# Altium footprint library AMLB_v1.PcbLib: 167 footprints (part 11 of 11)
Each footprint in its own frame and in the unit in brackets; x right, y up, seen from the top. Pads: shape width x height; smd on the part's side, far side on the other; paste and mask are expansions set on the pad; w line width, h text height; cw(c..) or ccw(c..) is an arc to the next point about the centre after c.
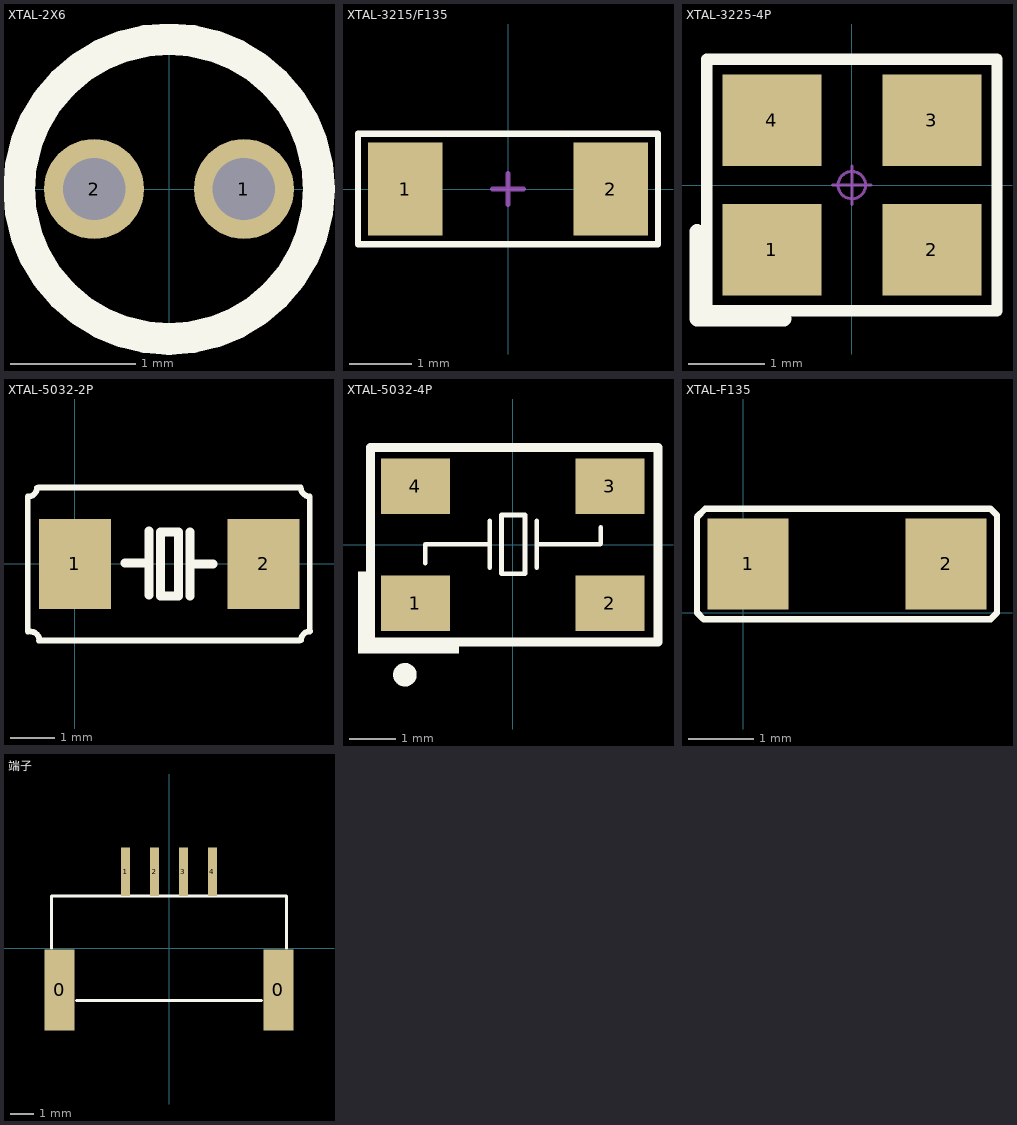
[diagram p10: the footprints below, top view; thin cyan lines are the x and y axes]

## XTAL-2X6 [mm]
pads (2):
  round 0.8 hole 0.5: 1(0.6,0) 2(-0.6,0)
Top Overlay:
  circle w0.254: c0,0 r1.2
3D body "2x6.STEP": height 6.4, standoff -4.9, extent -1.05,-1.05 1.05,1.05

## XTAL-3215/F135 [mm]
pads (2):
  rect 1.2x1.5 smd: 1(-1.65,0) 2(1.65,0)
Top Overlay:
  lines w0.1: -2.413,-0.889 -2.413,0.889 2.413,0.889 2.413,-0.889 -2.413,-0.889
Mechanical 15:
  lines w0.076: -0.254,0 0.254,0 ; 0,-0.254 0,0.254
3D body "User Library-X3215.STEP": height 0.81, standoff 0, extent -1.6,-0.75 1.6,0.75

## XTAL-3225-4P [mm] "3.2*2.5*0.7mm(长宽高)"
pads (4):
  rect 1.3x1.2 smd: 1(-1.05,-0.85) 2(1.05,-0.85) 3(1.05,0.85) 4(-1.05,0.85)
Top Overlay:
  lines w0.15: -1.905,-1.651 1.905,-1.651 1.905,1.651 -1.905,1.651 -1.905,-1.651
  lines w0.2: -2.032,-1.753 -0.889,-1.753 ; -2.032,-1.727 -2.032,-0.61
Mechanical 15:
  circle w0.04: c0,0 r0.18
  lines w0.04: -0.254,0 0.254,0 ; 0,-0.254 0,0.254
3D body "OSC 3225-4.STEP": height 0.7, standoff -0.02, extent -1.6,-1.25 1.6,1.25

## XTAL-5032-2P [mm] "5032"
height 1.3
pads (2):
  rect 1.6x2 smd: 1(0,0) 2(4.2,0)
Top Overlay:
  lines w0.127: -1.046,-1.5 -1.046,1.5 ; -1.041,1.499 ccw(c-1.041,1.699) -0.841,1.699 ; -0.987,-1.502 cw(c-0.987,-1.702) -0.787,-1.702 ; -0.8,-1.7 5,-1.7 ; -0.8,1.7 5,1.7 ; 5.029,1.702 ccw(c5.229,1.702) 5.229,1.502 ; 5.032,-1.699 cw(c5.232,-1.699) 5.232,-1.499 ; 5.228,-1.5 5.228,1.5
  lines w0.2: 1.118,0.025 1.651,0.025 ; 1.651,-0.686 1.651,0.737 ; 2.565,-0.711 2.565,0.711 ; 2.565,0 3.073,0 ; 1.905,-0.711 2.311,-0.711 2.311,0.711 1.905,0.711 1.905,-0.711

## XTAL-5032-4P [mm]
pads (4):
  rect 1.5x1.2 smd: 1(-2.108,-1.27) 2(2.108,-1.27) 3(2.108,1.27) 4(-2.108,1.27)
Top Overlay:
  circle w0.254: c-2.337,-2.819 r0.127
  rectangle: -3.353,-2.362 -3.175,-0.584
  rectangle: -3.175,-2.362 -1.168,-2.108
  lines w0.1: -1.897,-0.406 -1.897,0.008 -0.496,0.008 ; -0.496,-0.5 -0.496,0.516 ; 0.52,-0.5 0.52,0.516 ; 0.52,0.008 1.902,0.008 1.905,0.016 1.905,0.381 ; -0.242,-0.627 0.266,-0.627 0.266,-0.309 0.266,0.326 0.266,0.643 -0.242,0.643 -0.242,-0.627
  lines w0.2: -3.079,-2.108 -3.079,2.108 3.15,2.108 3.15,-2.108 -3.079,-2.108
3D body "User Library-CRYSTALSMD5X32.STEP": height 1, standoff 0, extent -2.5,-1.6 2.5,1.6

## XTAL-F135 [mm] "F135,32.758K"
height 0.762
pads (2):
  rect 1.25x1.4 smd: 1(0.075,0.75) 2(3.125,0.75)
Top Overlay:
  lines w0.1: -0.711,0.002 -0.711,1.473 -0.584,1.6 3.81,1.6 3.91,1.5 3.91,-0.001 3.812,-0.1 -0.61,-0.1 -0.711,0.002

## 端子 [mm] "4P"
pads (6):
  rect 1.3x3.5 smd: 0(-4.725,-1.8) 0(4.725,-1.8)
  rect 0.4x2.1 smd: 1(-1.875,3.3) 2(-0.625,3.3) 3(0.625,3.3) 4(1.875,3.3)
Top Overlay:
  lines w0.127: -5.08,0 -5.08,2.25 5.075,2.25 5.075,0 ; -4,-2.25 4,-2.25